# Altium footprint library SparkFun-Connectors.PCBLIB: 409 footprints (part 4 of 26)
Each footprint in its own frame and in the unit in brackets; x right, y up, seen from the top. Pads: shape width x height; smd on the part's side, far side on the other; paste and mask are expansions set on the pad; w line width, h text height; cw(c..) or ccw(c..) is an arc to the next point about the centre after c.
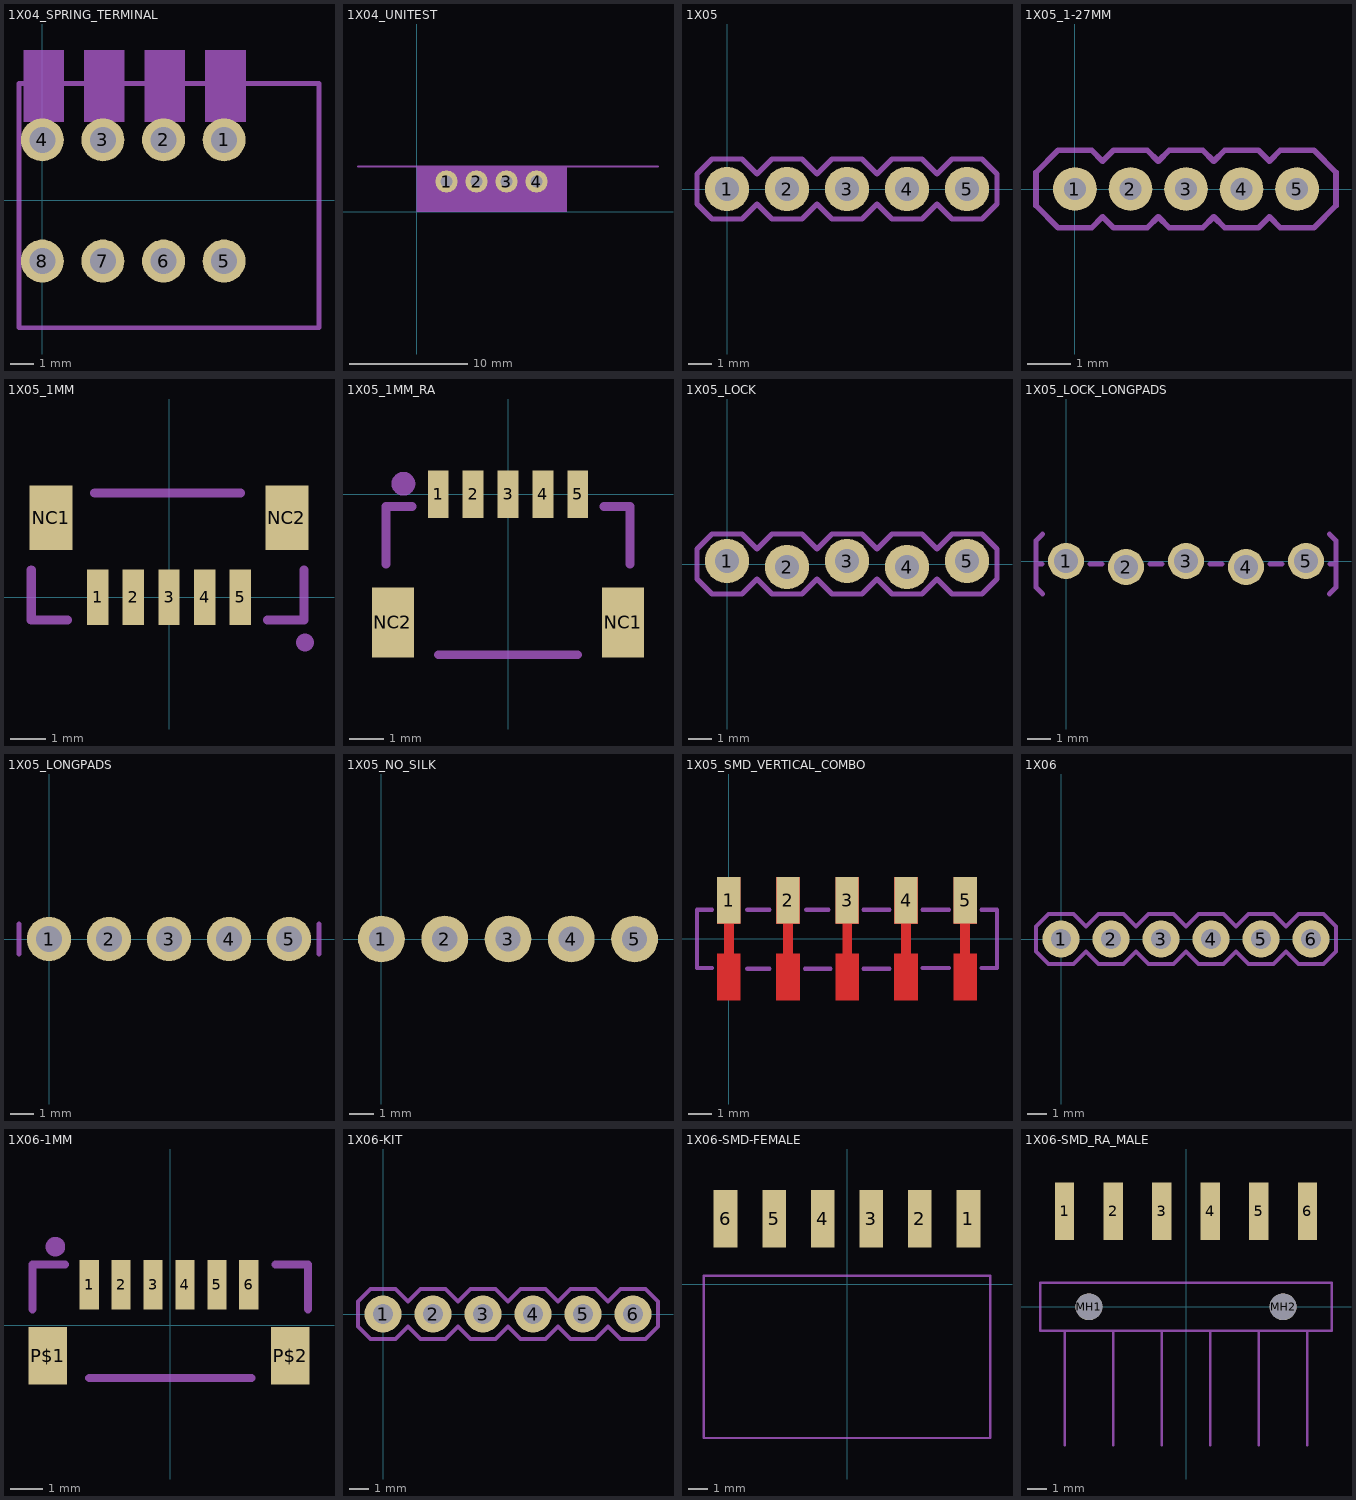
[diagram p3: the footprints below, top view; thin cyan lines are the x and y axes]

## 1X04_SPRING_TERMINAL [mil]
pads (8):
  round 70.87 hole 43.31: 1(300,100) 2(200,100) 3(100,100) 4(0,100) 5(300,-100) 6(200,-100) 7(100,-100) 8(0,-100)
tDocu:
  region: 335.43,248.03 335.43,129.92 269.29,129.92 269.29,248.03
  region: 235.43,248.03 235.43,129.92 169.29,129.92 169.29,248.03
  region: 135.43,248.03 135.43,129.92 69.29,129.92 69.29,248.03
  region: 35.43,248.03 35.43,129.92 -30.71,129.92 -30.71,248.03
tPlace:
  region: 35.43,193.03 35.43,129.92 -30.71,129.92 -30.71,193.03
  region: 135.43,193.03 135.43,129.92 69.29,129.92 69.29,193.03
  region: 235.43,193.03 235.43,129.92 169.29,129.92 169.29,193.03
  region: 335.43,193.03 335.43,129.92 269.29,129.92 269.29,193.03
  lines w8: -38.58,-210.24 456.69,-210.24 456.69,192.91 -38.58,192.91 -38.58,-210.24

## 1X04_UNITEST [mil]
pads (4):
  round 74 hole 40: 1(100,100) 2(200,100) 3(300,100) 4(400,100)
tDocu:
  region: 445,115 445,135 465,135 465,115
  region: 345,115 345,135 365,135 365,115
  region: 245,115 245,135 265,135 265,115
  region: 0,150 0,0 500,0 500,150
  lines w8: -195,150 805,150
  text "Board Edge" at 640,165 h34
  text "Clearance Area" at 120,40 h21.25
  text "Bottom Parts Only" at 105,10 h21.25

## 1X05 [mil]
pads (5):
  round 74 hole 40: 1(0,0) 2(100,0) 3(200,0) 4(300,0) 5(400,0)
tDocu:
  region: 390,-10 390,10 410,10 410,-10
  region: 290,-10 290,10 310,10 310,-10
  region: 190,-10 190,10 210,10 210,-10
  region: 90,-10 90,10 110,10 110,-10
  region: -10,-10 -10,10 10,10 10,-10
tPlace:
  lines w8: -50,-25 -50,25 -25,50 25,50 50,25 75,50 125,50 150,25 175,50 225,50 250,25 275,50 325,50 350,25 375,50 425,50 450,25 450,-25 425,-50 375,-50 350,-25 325,-50 275,-50 250,-25 225,-50 175,-50 150,-25 125,-50 75,-50 50,-25 25,-50 -25,-50 -50,-25

## 1X05_1-27MM [mm]
pads (5):
  round 1 hole 0.508: 1(0,0) 2(1.27,0) 3(2.54,0) 4(3.81,0) 5(5.08,0)
tPlace:
  lines w0.127: -0.889,-0.381 -0.381,-0.889 0.381,-0.889 0.635,-0.635 0.889,-0.889 1.651,-0.889 1.905,-0.635 2.159,-0.889 2.921,-0.889 3.175,-0.635 3.429,-0.889 4.191,-0.889 4.445,-0.635 4.699,-0.889 5.461,-0.889 5.969,-0.381 5.969,0.381 5.461,0.889 4.699,0.889 4.445,0.635 4.191,0.889 3.429,0.889 3.175,0.635 2.921,0.889 2.159,0.889 1.905,0.635 1.651,0.889 0.889,0.889 0.635,0.635 0.381,0.889 -0.381,0.889 -0.889,0.381 -0.889,-0.381

## 1X05_1MM [mm]
pads (7):
  rect 0.6x1.55 smd: 1(-2,0) 2(-1,0) 3(0,0) 4(1,0) 5(2,0)
  rect 1.2x1.8 smd: NC1(-3.3,2.225) NC2(3.3,2.225)
tPlace:
  circle w0.508: c3.81,-1.27 r0
  lines w0.254: -3.858,0.762 -3.858,-0.635 -2.842,-0.635 ; -2.08,2.921 2,2.921 ; 2.762,-0.635 3.778,-0.635 3.778,0.762

## 1X05_1MM_RA [mm]
pads (7):
  rect 0.6x1.35 smd: 1(-2,0) 2(-1,0) 3(0,0) 4(1,0) 5(2,0)
  rect 1.2x2 smd: NC1(3.3,-3.675) NC2(-3.3,-3.675)
tPlace:
  circle w0.4: c-3,0.3 r0.141
  lines w0.254: -3.5,-2 -3.5,-0.35 -2.75,-0.35 ; -2,-4.6 2,-4.6 ; 2.75,-0.35 3.5,-0.35 3.5,-2

## 1X05_LOCK [mil]
pads (5):
  round 74 hole 40: 1(0,5) 2(100,-5) 3(200,5) 4(300,-5) 5(400,5)
tDocu:
  region: 390,-10 390,10 410,10 410,-10
  region: 290,-10 290,10 310,10 310,-10
  region: 190,-10 190,10 210,10 210,-10
  region: 90,-10 90,10 110,10 110,-10
  region: -10,-10 -10,10 10,10 10,-10
tPlace:
  lines w8: -50,-25 -50,25 -25,50 25,50 50,25 75,50 125,50 150,25 175,50 225,50 250,25 275,50 325,50 350,25 375,50 425,50 450,25 450,-25 425,-50 375,-50 350,-25 325,-50 275,-50 250,-25 225,-50 175,-50 150,-25 125,-50 75,-50 50,-25 25,-50 -25,-50 -50,-25

## 1X05_LOCK_LONGPADS [mil]
pads (5):
  round 60 hole 40: 1(0,0) 2(100,-10) 3(200,0) 4(300,-10) 5(400,0)
tDocu:
  region: -11.5,-16.5 -11.5,6.5 11.5,6.5 11.5,-16.5
  region: 88.5,-16.5 88.5,6.5 111.5,6.5 111.5,-16.5
  region: 188.5,-16.5 188.5,6.5 211.5,6.5 211.5,-16.5
  region: 311.5,-16.5 288.5,-16.5 288.5,6.5 311.5,6.5
  region: 388.5,-16.5 388.5,6.5 411.5,6.5 411.5,-16.5
tPlace:
  lines w8: -40,-5 -50,-5 ; -39,-55 -50,-44 -50,-5 ; -39,45 -50,34 -50,-5 ; 40,-5 60,-5 ; 140,-5 160,-5 ; 240,-5 260,-5 ; 340,-5 360,-5 ; 439,-55 450,-44 450,-5 ; 439,45 450,34 450,-5 ; 440,-5 450,-5

## 1X05_LONGPADS [mil]
pads (5):
  round 74 hole 44: 1(0,0) 2(100,0) 3(200,0) 4(300,0) 5(400,0)
tDocu:
  region: 390,-10 390,10 410,10 410,-10
  region: 290,-10 290,10 310,10 310,-10
  region: 190,-10 190,10 210,10 210,-10
  region: 90,-10 90,10 110,10 110,-10
  region: -10,-10 -10,10 10,10 10,-10
tPlace:
  lines w8: -50,-25 -50,25 ; 450,-25 450,25

## 1X05_NO_SILK [mil]
pads (5):
  round 74 hole 40: 1(0,0) 2(100,0) 3(200,0) 4(300,0) 5(400,0)
tDocu:
  region: 390,-10 390,10 410,10 410,-10
  region: 290,-10 290,10 310,10 310,-10
  region: 190,-10 190,10 210,10 210,-10
  region: 90,-10 90,10 110,10 110,-10
  region: -10,-10 -10,10 10,10 10,-10

## 1X05_SMD_VERTICAL_COMBO [mm]
pads (5):
  rect 1x2 smd mask+0: 1(0,1.65) 2(2.54,1.65)
  rect 1x2 smd paste+0 mask+0: 3(5.08,1.65) 4(7.62,1.652) 5(10.16,1.65)
Top:
  region: 2.04,2.65 3.04,2.65 3.04,0.65 2.74,0.65 2.74,-0.65 3.04,-0.65 3.04,-2.65 2.04,-2.65 2.04,-0.65 2.34,-0.65 2.34,0.65 2.04,0.65
  region: -0.5,2.65 0.5,2.65 0.5,0.65 0.2,0.65 0.2,-0.65 0.5,-0.65 0.5,-2.65 -0.5,-2.65 -0.5,-0.65 -0.2,-0.65 -0.2,0.65 -0.5,0.65
  region: 4.59,2.65 5.59,2.65 5.59,0.65 5.29,0.65 5.29,-0.65 5.59,-0.65 5.59,-2.65 4.59,-2.65 4.59,-0.65 4.89,-0.65 4.89,0.65 4.59,0.65
  region: 7.12,2.65 8.12,2.65 8.12,0.65 7.82,0.65 7.82,-0.65 8.12,-0.65 8.12,-2.65 7.12,-2.65 7.12,-0.65 7.42,-0.65 7.42,0.65 7.12,0.65
  region: 9.66,2.65 10.66,2.65 10.66,0.65 10.36,0.65 10.36,-0.65 10.66,-0.65 10.66,-2.65 9.66,-2.65 9.66,-0.65 9.96,-0.65 9.96,0.65 9.66,0.65
Top Paste:
  region: 3.12,-0.56 3.12,-2.76 1.92,-2.76 1.92,-0.56
  region: 3.14,2.74 3.14,0.54 1.94,0.54 1.94,2.74
  region: 0.58,-0.56 0.58,-2.76 -0.62,-2.76 -0.62,-0.56
  region: 0.6,2.74 0.6,0.54 -0.6,0.54 -0.6,2.74
  region: 5.67,-0.56 5.67,-2.76 4.47,-2.76 4.47,-0.56
  region: 5.69,2.74 5.69,0.54 4.49,0.54 4.49,2.74
  region: 8.2,-0.56 8.2,-2.76 7,-2.76 7,-0.56
  region: 8.22,2.74 8.22,0.54 7.02,0.54 7.02,2.74
  region: 10.74,-0.56 10.74,-2.76 9.54,-2.76 9.54,-0.56
  region: 10.76,2.74 10.76,0.54 9.56,0.54 9.56,2.74
Top Solder:
  region: 3.12,-0.56 3.12,-2.76 1.92,-2.76 1.92,-0.56
  region: 3.14,2.74 3.14,0.54 1.94,0.54 1.94,2.74
  region: 0.58,-0.56 0.58,-2.76 -0.62,-2.76 -0.62,-0.56
  region: 0.6,2.74 0.6,0.54 -0.6,0.54 -0.6,2.74
  region: 5.67,-0.56 5.67,-2.76 4.47,-2.76 4.47,-0.56
  region: 5.69,2.74 5.69,0.54 4.49,0.54 4.49,2.74
  region: 8.2,-0.56 8.2,-2.76 7,-2.76 7,-0.56
  region: 8.22,2.74 8.22,0.54 7.02,0.54 7.02,2.74
  region: 10.74,-0.56 10.74,-2.76 9.54,-2.76 9.54,-0.56
  region: 10.76,2.74 10.76,0.54 9.56,0.54 9.56,2.74
tPlace:
  lines w0.178: -0.73,-1.25 -1.37,-1.25 -1.37,1.25 -0.73,1.25 ; 0.789,-1.29 1.751,-1.29 ; 0.789,1.25 1.751,1.25 ; 3.278,-1.29 4.367,-1.29 ; 3.329,1.25 4.291,1.25 ; 5.793,-1.29 6.907,-1.29 ; 5.793,1.25 6.907,1.25 ; 8.32,-1.25 9.473,-1.25 ; 8.32,1.25 9.473,1.25 ; 10.86,-1.25 11.53,-1.25 11.53,1.25 10.86,1.25

## 1X06 [mil]
pads (6):
  round 74 hole 40: 1(0,0) 2(100,0) 3(200,0) 4(300,0) 5(400,0) 6(500,0)
tDocu:
  region: 490,-10 490,10 510,10 510,-10
  region: 390,-10 390,10 410,10 410,-10
  region: 290,-10 290,10 310,10 310,-10
  region: 190,-10 190,10 210,10 210,-10
  region: 90,-10 90,10 110,10 110,-10
  region: -10,-10 -10,10 10,10 10,-10
tPlace:
  lines w8: -50,-25 -50,25 -25,50 25,50 50,25 75,50 125,50 150,25 175,50 225,50 250,25 275,50 325,50 350,25 375,50 425,50 450,25 475,50 525,50 550,25 550,-25 525,-50 475,-50 450,-25 425,-50 375,-50 350,-25 325,-50 275,-50 250,-25 225,-50 175,-50 150,-25 125,-50 75,-50 50,-25 25,-50 -25,-50 -50,-25

## 1X06-1MM [mm]
pads (8):
  rect 0.6x1.55 smd: 1(-2.54,1.27) 2(-1.54,1.27) 3(-0.54,1.27) 4(0.46,1.27) 5(1.46,1.27) 6(2.46,1.27)
  rect 1.2x1.8 smd: P$1(-3.84,-0.955) P$2(3.76,-0.955)
tPlace:
  circle w0.406: c-3.6,2.47 r0.105
  lines w0.254: -4.318,0.508 -4.318,1.905 -3.302,1.905 ; -2.54,-1.651 2.54,-1.651 ; 3.302,1.905 4.318,1.905 4.318,0.508

## 1X06-KIT [mil]
pads (6):
  round 74 hole 40: 1(0,0) 2(100,0) 3(200,0) 4(300,0) 5(400,0) 6(500,0)
Top Solder:
  region: 0,-17.5 -3.4,-17.58 -9.75,-15.12 -14.67,-10.43 -17.42,-4.2 -17.5,-0.8 -17.59,2.77 -15.02,9.44 -10.1,14.61 -3.57,17.51 0,17.6 3.52,17.54 9.98,14.74 14.88,9.67 17.46,3.12 17.4,-0.4 17.37,-3.83 14.69,-10.15 9.79,-14.96 3.43,-17.53 0,-17.5
  region: 100,-17.5 96.6,-17.58 90.25,-15.12 85.33,-10.43 82.58,-4.2 82.5,-0.8 82.41,2.77 84.98,9.44 89.9,14.61 96.43,17.51 100,17.6 103.52,17.54 109.98,14.74 114.88,9.67 117.46,3.12 117.4,-0.4 117.37,-3.83 114.69,-10.15 109.79,-14.96 103.43,-17.53 100,-17.5
  region: 200,-17.5 196.6,-17.58 190.25,-15.12 185.33,-10.43 182.58,-4.2 182.5,-0.8 182.41,2.77 184.98,9.44 189.9,14.61 196.43,17.51 200,17.6 203.52,17.54 209.98,14.74 214.88,9.67 217.46,3.12 217.4,-0.4 217.37,-3.83 214.69,-10.15 209.79,-14.96 203.43,-17.53 200,-17.5
  region: 300,-17.5 296.6,-17.58 290.25,-15.12 285.33,-10.43 282.58,-4.2 282.5,-0.8 282.41,2.77 284.98,9.44 289.9,14.61 296.43,17.51 300,17.6 303.52,17.54 309.98,14.74 314.88,9.67 317.46,3.12 317.4,-0.4 317.37,-3.83 314.69,-10.15 309.79,-14.96 303.43,-17.53 300,-17.5
  region: 400,-17.5 396.6,-17.58 390.25,-15.12 385.33,-10.43 382.58,-4.2 382.5,-0.8 382.41,2.77 384.98,9.44 389.9,14.61 396.43,17.51 400,17.6 403.52,17.54 409.98,14.74 414.88,9.67 417.46,3.12 417.4,-0.4 417.37,-3.83 414.69,-10.15 409.79,-14.96 403.43,-17.53 400,-17.5
  region: 500,-17.5 496.6,-17.58 490.25,-15.12 485.33,-10.43 482.58,-4.2 482.5,-0.8 482.41,2.77 484.98,9.44 489.9,14.61 496.43,17.51 500,17.6 503.52,17.54 509.98,14.74 514.88,9.67 517.46,3.12 517.4,-0.4 517.37,-3.83 514.69,-10.15 509.79,-14.96 503.43,-17.53 500,-17.5
Bottom Solder:
  drawing of 6 lines, arcs and shapes, not listed
tDocu:
  region: 490,-10 490,10 510,10 510,-10
  region: 390,-10 390,10 410,10 410,-10
  region: 290,-10 290,10 310,10 310,-10
  region: 190,-10 190,10 210,10 210,-10
  region: 90,-10 90,10 110,10 110,-10
  region: -10,-10 -10,10 10,10 10,-10
  lines w8: -50,-25 -50,25 -25,50 25,50 50,25 75,50 125,50 150,25 175,50 225,50 250,25 275,50 325,50 350,25 375,50 425,50 450,25 475,50 525,50 550,25 550,-25 525,-50 475,-50 450,-25 425,-50 375,-50 350,-25 325,-50 275,-50 250,-25 225,-50 175,-50 150,-25 125,-50 75,-50 50,-25 25,-50 -25,-50 -50,-25

## 1X06-SMD-FEMALE [mm]
pads (6):
  rect 1.25x3 smd: 1(6.35,3.425) 2(3.81,3.425) 3(1.27,3.425) 4(-1.27,3.425) 5(-3.81,3.425) 6(-6.35,3.425)
tPlace:
  lines w0.127: -7.5,-8.05 -7.5,0.45 7.5,0.45 7.5,-8.05 -7.5,-8.05

## 1X06-SMD_RA_MALE [mm]
pads (8):
  rect 1x3 smd: 1(-6.35,5) 2(-3.81,5) 3(-1.27,5) 4(1.27,5) 5(3.81,5) 6(6.35,5)
  round 1.4 hole 1.4 unplated: MH1(-5.08,0) MH2(5.08,0)
tDocu:
  lines w0.127: -6.35,-7.25 -6.35,-1.25 ; -3.81,-7.25 -3.81,-1.25 ; -1.27,-7.25 -1.27,-1.25 ; 1.27,-7.25 1.27,-1.25 ; 3.81,-7.25 3.81,-1.25 ; 6.35,-7.25 6.35,-1.25 ; -6.35,-1.25 -7.62,-1.25 -7.62,1.25 7.62,1.25 7.62,-1.25 6.35,-1.25 ; -6.35,-1.25 -3.81,-1.25 ; -3.81,-1.25 -1.27,-1.25 ; -1.27,-1.25 1.27,-1.25 ; 1.27,-1.25 3.81,-1.25 ; 3.81,-1.25 6.35,-1.25